# Altium footprint library PCB Library.PcbLib: 19 footprints (part 2 of 2)
Each footprint in its own frame and in the unit in brackets; x right, y up, seen from the top. Pads: shape width x height; smd on the part's side, far side on the other; paste and mask are expansions set on the pad; w line width, h text height; cw(c..) or ccw(c..) is an arc to the next point about the centre after c.
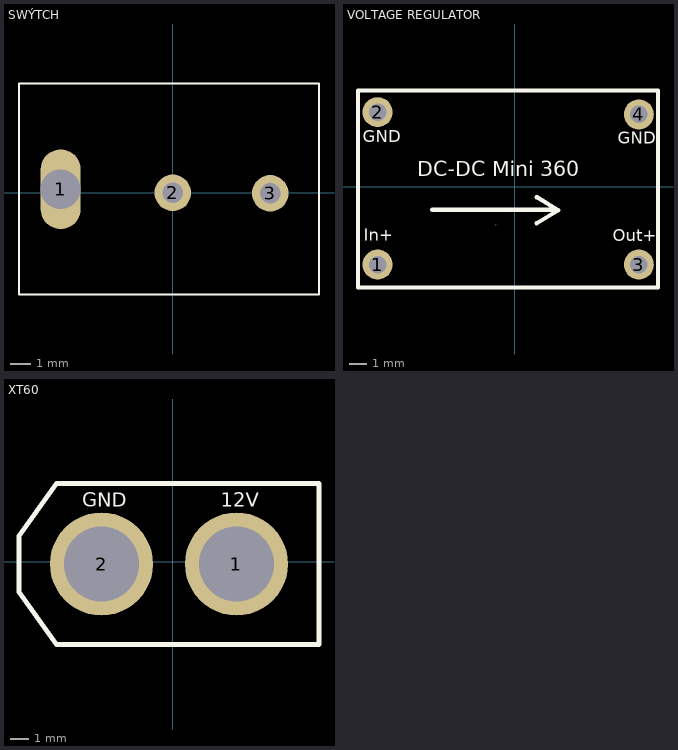
[diagram p1: the footprints below, top view; thin cyan lines are the x and y axes]

## SWÝTCH [mil]
pads (3):
  oval 78.74x157.48 hole 78.74: 1(-221,7)
  round 71.89 hole 40.39: 2(0,0) 3(192,-1)
Top Overlay:
  lines w3.94: -303,-200 -303,215 288,215 288,-200 -303,-200
3D body "switch_on_off_mini.step": height 570.87, standoff -196.85, extent -303.27,-200.69 287.28,212.7

## VOLTAGE REGULATOR [mil]
pads (4):
  round 68.9 hole 40: 1(-315,-178.81) 2(-315,171.19) 3(285,-178.81) 4(285,166.19)
Top Overlay:
  lines w10: -189.59,-53 86,-53 ; 50,-83.81 100,-53.81 50,-23.82 ; -360,-231.57 328.98,-231.57 328.98,221.19 -360,221.19 -360,-231.57
  text "In+" at -347,-133 h47.24
  text "GND" at -349,93 h47.24
  text "Out+" at 225,-134 h47.24
  text "GND" at 236,90 h47.24
  text "DC-DC Mini 360" at -224,13 h59.06
Mechanical 15:
  lines w0.1: -44.13,-88.41 -42.13,-86.41
3D body "User Library-mini360 STEP DOWN DC DC 2.STEP": height 169.48, standoff 3.94, extent -372.15,-233.44 340.15,239
3D body "Pin Header 1x1 TH Pitch 2.54mm.stp": height 125.98, standoff -373.85, extent -379,137 -279,237
3D body "Pin Header 1x1 TH Pitch 2.54mm.stp": height 125.98, standoff -373.85, extent 251,141 351,241
3D body "Pin Header 1x1 TH Pitch 2.54mm.stp": height 125.98, standoff -373.85, extent 249,-240 349,-140
3D body "Pin Header 1x1 TH Pitch 2.54mm.stp": height 125.98, standoff -373.85, extent -379,-243 -279,-143

## XT60 [mil]
pads (2):
  round 216.5 hole 157.48: 1(133.5,-4.29) 2(-149.96,-4.29)
Top Overlay:
  lines w10: -323.19,-63.35 -323.19,54.76 -244.45,165 306.73,165 306.73,-173.58 -244.45,-173.58 -323.19,-63.35
  text "12V" at 100.04,115.71 h29.53
  text "GND" at -189.96,115.71 h29.53
Mechanical 15:
  lines w0.1: -1,-1 1,1
3D body "User Library-XT60.step": height 664.37, standoff -201.77, extent -324.64,-157.29 302.72,162.71